# Altium footprint library SMDLibrary.PcbLib: 309 footprints (part 18 of 20)
Each footprint in its own frame and in the unit in brackets; x right, y up, seen from the top. Pads: shape width x height; smd on the part's side, far side on the other; paste and mask are expansions set on the pad; w line width, h text height; cw(c..) or ccw(c..) is an arc to the next point about the centre after c.
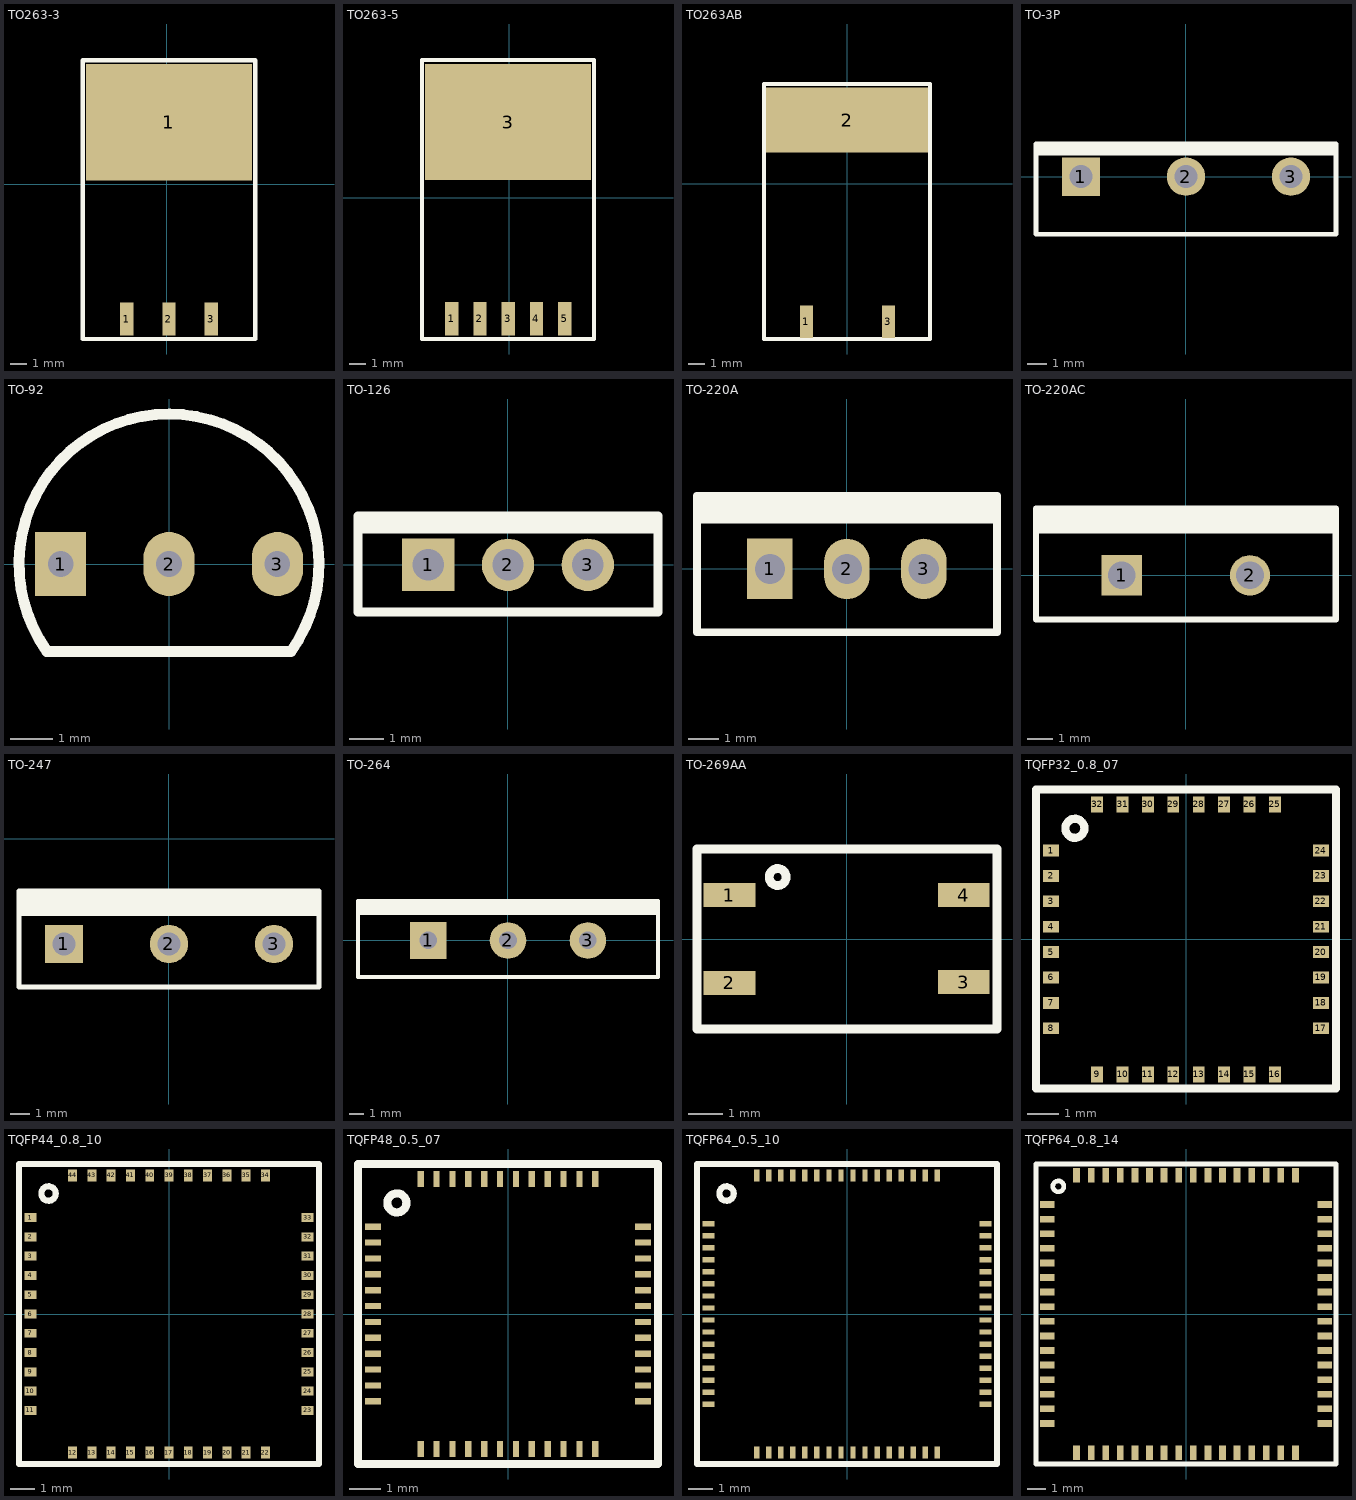
[diagram p17: the footprints below, top view; thin cyan lines are the x and y axes]

## TO263-3 [mm]
pads (4):
  rect 0.8x2 smd: 1(-2.418,-8.095) 2(0.122,-8.095) 3(2.662,-8.095)
  rect 10x7 smd: 1(0.122,3.741)
Top Overlay:
  lines w0.254: -5.055,-9.296 5.309,-9.296 5.309,7.468 -5.055,7.468 -5.055,-6.262 -5.055,-9.296
3D body "SW3dPS-TO263-3.STEP": height 4.78, standoff -0.02, extent -4.878,-8.742 5.122,6.928

## TO263-5 [mm]
pads (6):
  rect 0.8x2 smd: 1(-3.454,-7.286) 2(-1.754,-7.286) 3(-0.054,-7.286) 4(1.646,-7.286) 5(3.346,-7.286)
  rect 10x7 smd: 3(-0.054,4.55)
Top Overlay:
  lines w0.254: -5.232,-8.509 5.105,-8.509 5.105,8.28 -5.232,8.28 -5.232,-5.454 -5.232,-8.509
3D body "SW3dPS-TO263-5.STEP": height 4.79, standoff -0.01, extent -5.054,-7.933 4.946,7.737

## TO263AB [mm]
pads (3):
  rect 0.8x2 smd: 1(-2.525,-8.475) 3(2.525,-8.475)
  rect 10x4 smd: 2(-0.025,3.925)
Top Overlay:
  lines w0.254: 5.075,-9.55 5.075,-9.55 ; 5.075,-9.55 -5.125,-9.55 -5.125,6.147 5.075,6.147 5.075,-9.55
3D body "SW3dPS-DPAK.STEP": height 4.98, standoff -0.03, extent -5.08,-9.416 5.08,5.848

## TO-3P [mm]
pads (3):
  rect 2x2 hole 1.2: 1(-5.46,0)
  round 2 hole 1.2: 2(0,0) 3(5.46,0)
Top Overlay:
  rectangle: -7.8,1.11 7.8,1.71
  lines w0.254: -7.8,-3 7.8,-3 7.8,1.71 -7.8,1.71 -7.8,-3
3D body "User Library-Fairchild_TO-3P.STEP": height 25.9, standoff -14, extent -7.8,-3 7.8,1.71

## TO-92 [mm]
pads (3):
  rect 1.2x1.5 hole 0.6: 1(-2.54,0)
  oval 1.2x1.5 hole 0.6: 2(0,0) 3(2.54,0)
Top Overlay:
  lines w0.254: -2.867,-2.033 cw(c0,0) 2.857,-2.048 ; -2.865,-2.05 2.86,-2.05
3D body "TO-92 Formed Leads.stp": height 7.58, standoff -4, extent -2.77,-1.21 2.77,2.35

## TO-126 [mm]
pads (3):
  rect 1.5x1.5 hole 0.9: 1(-2.29,0)
  round 1.5 hole 0.9: 2(0,0) 3(2.29,0)
Top Overlay:
  rectangle: -4.3,0.9 4.3,1.4
  lines w0.254: -4.3,-1.35 4.3,-1.35 4.3,1.4 -4.3,1.4 -4.3,-1.35
3D body "TO-126_factory.stp": height 15.8, standoff -9, extent -4.3,-1.35 4.3,1.4

## TO-220A [mm]
pads (3):
  rect 1.5x2 hole 1: 1(-2.54,0)
  oval 1.5x2 hole 1: 2(0,0) 3(2.54,0)
Top Overlay:
  rectangle: -4.947,1.5 4.953,2.413
  lines w0.254: -4.947,-2.087 4.953,-2.087 4.953,2.413 -4.947,2.413 -4.947,-2.087
3D body "User Library-TO-220-1.STEP": height 20.58, standoff -8.2, extent -4.947,-2.087 4.953,2.413

## TO-220AC [mm]
pads (2):
  rect 1.6x1.6 hole 1.1: 1(-2.54,0)
  round 1.6 hole 1.1: 2(2.54,0)
Top Overlay:
  rectangle: -5.942,1.65 5.95,2.65
  lines w0.254: -5.942,-1.75 -5.942,2.65 5.942,2.65 5.942,-1.75 -5.942,-1.75
3D body "TO-220 2pins long V1.stp": height 19.11, standoff -10.88, extent -5.942,-1.75 5.942,2.65

## TO-247 [mm]
pads (3):
  rect 2x2 hole 1.2: 1(-5.46,-5.46)
  round 2 hole 1.2: 2(0,-5.46) 3(5.46,-5.46)
Top Overlay:
  rectangle: -7.8,-4 7.8,-2.7
  lines w0.254: -7.8,-7.7 -7.8,-2.7 7.8,-2.7 7.8,-7.7 -7.8,-7.7
3D body "TO-247_factory.stp": height 27.3, standoff -15.4, extent -7.8,-7.7 7.8,-2.7

## TO-264 [mm]
pads (3):
  rect 2.5x2.5 hole 1.2: 1(-5.461,0)
  round 2.5 hole 1.2: 2(0,0) 3(5.461,0)
Top Overlay:
  rectangle: -10.25,1.75 10.25,2.7
  lines w0.254: -10.25,-2.5 10.25,-2.5 10.25,2.7 -10.25,2.7 -10.25,-2.5
3D body "User Library-to264.STEP": height 31.72, standoff -14.25, extent -10.25,-2.5 10.25,2.7

## TO-269AA [mm]
pads (4):
  rect 1.5x0.7 smd: 1(-3.4,1.275) 2(-3.4,-1.275) 3(3.4,-1.25) 4(3.4,1.275)
Top Overlay:
  circle w0.254: c-2,1.8 r0.246
  lines w0.254: -4.343,-2.616 -4.343,2.616 4.369,2.616 4.369,-2.616 -4.343,-2.616
3D body "User Library-TO-269AA_jam.STEP": height 2.7, standoff 0, extent -3.52,-2.475 3.52,2.475

## TQFP32_0.8_07 [mm]
pads (32):
  rect 0.5x0.37 smd: 1(-4.25,2.8) 2(-4.25,2) 3(-4.25,1.2) 4(-4.25,0.4) 5(-4.25,-0.4) 6(-4.25,-1.2) 7(-4.25,-2) 8(-4.25,-2.8) 17(4.25,-2.8) 18(4.25,-2) 19(4.25,-1.2) 20(4.25,-0.4) 21(4.25,0.4) 22(4.25,1.2) 23(4.25,2) 24(4.25,2.8)
  rect 0.37x0.5 smd: 9(-2.8,-4.25) 10(-2,-4.25) 11(-1.2,-4.25) 12(-0.4,-4.25) 13(0.4,-4.25) 14(1.2,-4.25) 15(2,-4.25) 16(2.8,-4.25) 25(2.8,4.25) 26(2,4.25) 27(1.2,4.25) 28(0.4,4.25) 29(-0.4,4.25) 30(-1.2,4.25) 31(-2,4.25) 32(-2.8,4.25)
Top Overlay:
  circle w0.254: c-3.5,3.5 r0.3
  lines w0.254: -4.725,-4.7 4.725,-4.7 4.725,4.725 -4.725,4.725 -4.725,-4.7
3D body "User Library-LQFP32-0_8.STEP": height 1.65, standoff -0.01, extent -4.5,-4.519 4.539,4.519

## TQFP44_0.8_10 [mm]
pads (44):
  rect 0.5x0.37 smd: 1(-5.75,4) 2(-5.75,3.2) 3(-5.75,2.4) 4(-5.75,1.6) 5(-5.75,0.8) 6(-5.75,0) 7(-5.75,-0.8) 8(-5.75,-1.6) 9(-5.75,-2.4) 10(-5.75,-3.2) 11(-5.75,-4) 23(5.75,-4) 24(5.75,-3.2) 25(5.75,-2.4) 26(5.75,-1.6) 27(5.75,-0.8) 28(5.75,0) 29(5.75,0.8) 30(5.75,1.6) 31(5.75,2.4) 32(5.75,3.2) 33(5.75,4)
  rect 0.37x0.5 smd: 12(-4,-5.75) 13(-3.2,-5.75) 14(-2.4,-5.75) 15(-1.6,-5.75) 16(-0.8,-5.75) 17(0,-5.75) 18(0.8,-5.75) 19(1.6,-5.75) 20(2.4,-5.75) 21(3.2,-5.75) 22(4,-5.75) 34(4,5.75) 35(3.2,5.75) 36(2.4,5.75) 37(1.6,5.75) 38(0.8,5.75) 39(0,5.75) 40(-0.8,5.75) 41(-1.6,5.75) 42(-2.4,5.75) 43(-3.2,5.75) 44(-4,5.75)
Top Overlay:
  circle w0.254: c-5,5 r0.3
  lines w0.254: -6.225,-6.225 6.225,-6.225 6.225,6.225 -6.225,6.225 -6.225,-6.225
3D body "User Library-TQFP-44-1.STEP": height 1.1, standoff 0, extent -6,-6 6,6

## TQFP48_0.5_07 [mm]
pads (48):
  rect 0.5x0.2 smd: 1(-4.25,2.75) 2(-4.25,2.25) 3(-4.25,1.75) 4(-4.25,1.25) 5(-4.25,0.75) 6(-4.25,0.25) 7(-4.25,-0.25) 8(-4.25,-0.75) 9(-4.25,-1.25) 10(-4.25,-1.75) 11(-4.25,-2.25) 12(-4.25,-2.75) 25(4.25,-2.75) 26(4.25,-2.25) 27(4.25,-1.75) 28(4.25,-1.25) 29(4.25,-0.75) 30(4.25,-0.25) 31(4.25,0.25) 32(4.25,0.75) 33(4.25,1.25) 34(4.25,1.75) 35(4.25,2.25) 36(4.25,2.75)
  rect 0.2x0.5 smd: 13(-2.75,-4.25) 14(-2.25,-4.25) 15(-1.75,-4.25) 16(-1.25,-4.25) 17(-0.75,-4.25) 18(-0.25,-4.25) 19(0.25,-4.25) 20(0.75,-4.25) 21(1.25,-4.25) 22(1.75,-4.25) 23(2.25,-4.25) 24(2.75,-4.25) 37(2.75,4.25) 38(2.25,4.25) 39(1.75,4.25) 40(1.25,4.25) 41(0.75,4.25) 42(0.25,4.25) 43(-0.25,4.25) 44(-0.75,4.25) 45(-1.25,4.25) 46(-1.75,4.25) 47(-2.25,4.25) 48(-2.75,4.25)
Top Overlay:
  circle w0.254: c-3.5,3.5 r0.3
  lines w0.254: -4.725,-4.725 4.725,-4.725 4.725,4.725 -4.725,4.725 -4.725,-4.725
3D body "User Library-LQFP48.STEP": height 1.5, standoff 0, extent -4.5,-4.5 4.5,4.5

## TQFP64_0.5_10 [mm]
pads (64):
  rect 0.5x0.22 smd: 1(-5.75,3.75) 2(-5.75,3.25) 3(-5.75,2.75) 4(-5.75,2.25) 5(-5.75,1.75) 6(-5.75,1.25) 7(-5.75,0.75) 8(-5.75,0.25) 9(-5.75,-0.25) 10(-5.75,-0.75) 11(-5.75,-1.25) 12(-5.75,-1.75) 13(-5.75,-2.25) 14(-5.75,-2.75) 15(-5.75,-3.25) 16(-5.75,-3.75) 33(5.75,-3.75) 34(5.75,-3.25) 35(5.75,-2.75) 36(5.75,-2.25) 37(5.75,-1.75) 38(5.75,-1.25) 39(5.75,-0.75) 40(5.75,-0.25) 41(5.75,0.25) 42(5.75,0.75) 43(5.75,1.25) 44(5.75,1.75) 45(5.75,2.25) 46(5.75,2.75) 47(5.75,3.25) 48(5.75,3.75)
  rect 0.22x0.5 smd: 17(-3.75,-5.75) 18(-3.25,-5.75) 19(-2.75,-5.75) 20(-2.25,-5.75) 21(-1.75,-5.75) 22(-1.25,-5.75) 23(-0.75,-5.75) 24(-0.25,-5.75) 25(0.25,-5.75) 26(0.75,-5.75) 27(1.25,-5.75) 28(1.75,-5.75) 29(2.25,-5.75) 30(2.75,-5.75) 31(3.25,-5.75) 32(3.75,-5.75) 49(3.75,5.75) 50(3.25,5.75) 51(2.75,5.75) 52(2.25,5.75) 53(1.75,5.75) 54(1.25,5.75) 55(0.75,5.75) 56(0.25,5.75) 57(-0.25,5.75) 58(-0.75,5.75) 59(-1.25,5.75) 60(-1.75,5.75) 61(-2.25,5.75) 62(-2.75,5.75) 63(-3.25,5.75) 64(-3.75,5.75)
Top Overlay:
  circle w0.254: c-5,5 r0.3
  lines w0.254: -6.225,-6.225 -6.225,6.225 6.225,6.225 6.225,-6.225 -6.225,-6.225
3D body: height 1.5, standoff 0, extent 0,0 0,0
3D body: height 6.07, standoff -6.07, extent 0,0 0,0
3D body "User Library-lqpf64.STEP": height 1.5, standoff 0.02, extent -6,-6 6,6

## TQFP64_0.8_14 [mm]
pads (64):
  rect 0.8x0.37 smd: 1(-7.6,6) 2(-7.6,5.2) 3(-7.6,4.4) 4(-7.6,3.6) 5(-7.6,2.8) 6(-7.6,2) 7(-7.6,1.2) 8(-7.6,0.4) 9(-7.6,-0.4) 10(-7.6,-1.2) 11(-7.6,-2) 12(-7.6,-2.8) 13(-7.6,-3.6) 14(-7.6,-4.4) 15(-7.6,-5.2) 16(-7.6,-6) 33(7.6,-6) 34(7.6,-5.2) 35(7.6,-4.4) 36(7.6,-3.6) 37(7.6,-2.8) 38(7.6,-2) 39(7.6,-1.2) 40(7.6,-0.4) 41(7.6,0.4) 42(7.6,1.2) 43(7.6,2) 44(7.6,2.8) 45(7.6,3.6) 46(7.6,4.4) 47(7.6,5.2) 48(7.6,6)
  rect 0.37x0.8 smd: 17(-6,-7.6) 18(-5.2,-7.6) 19(-4.4,-7.6) 20(-3.6,-7.6) 21(-2.8,-7.6) 22(-2,-7.6) 23(-1.2,-7.6) 24(-0.4,-7.6) 25(0.4,-7.6) 26(1.2,-7.6) 27(2,-7.6) 28(2.8,-7.6) 29(3.6,-7.6) 30(4.4,-7.6) 31(5.2,-7.6) 32(6,-7.6) 49(6,7.6) 50(5.2,7.6) 51(4.4,7.6) 52(3.6,7.6) 53(2.8,7.6) 54(2,7.6) 55(1.2,7.6) 56(0.4,7.6) 57(-0.4,7.6) 58(-1.2,7.6) 59(-2,7.6) 60(-2.8,7.6) 61(-3.6,7.6) 62(-4.4,7.6) 63(-5.2,7.6) 64(-6,7.6)
Top Overlay:
  circle w0.254: c-7,7 r0.3
  lines w0.254: -8.225,-8.225 -8.225,8.225 8.225,8.225 8.225,-8.225 -8.225,-8.225
3D body "User Library-TQFP 64 14x14mm 0_8mm pitch.STEP": height 1.48, standoff -0.02, extent -8,-8 8,8